# Altium footprint library 6-Connectors-2.PcbLib: 57 footprints (part 3 of 7) (continued)
## HARTING_02 02 160 2201 [mm] "Backplane Connector; Har-bus 64, Thru-Hole; Rows z+a+b+c+d, Press-in 160 Female Contacts" (continued)
  text "d" at 6.475,-0.45 h1.2
  text "c" at 2.275,1.425 h1.2
  text "z" at -5.725,1.375 h1.2
  text "a" at -3.14,1.39 h1.2
  text "b" at -0.425,1.4 h1.2
  text "30" at -10.675,-74.3 h1.2
  text "25" at -10.725,-61.6 h1.2
  text "20" at -10.675,-48.875 h1.2
  text "15" at -10.495,-36.185 h1.2
  text "10" at -10.495,-23.485 h1.2
  text "5" at -9.625,-10.795 h1.2
  text "32" at -10.7,-79.375 h1.2
  text "1" at -9.17,-0.675 h1.2
Drill Drawing:
  lines w0.1: -7.62,-58.42 -7.62,-81.28 7.62,-81.28 7.62,2.54 -7.62,2.54 -7.62,-20.32
  text "PRESS-FIT TECHNOLOGY diam. 1mm +0.1 -0" at -6.985,-56.515 h1
3D body "HARTING_02 02 160 2201.stp": height 11.6, standoff -4.95, extent -8,-86.82 8,8.08

## HARTING_02 02 160 2301 [mm] "Backplane Connector; Har-bus 64, 17mm Pres-in Terminations; Rows z+a+b+c+d, Press-in 160 Female Contacts"
height 11.6
pads (162):
  round 1.5 hole 1: a1(-2.54,0) a2(-2.54,-2.54) a3(-2.54,-5.08) a4(-2.54,-7.62) a5(-2.54,-10.16) a6(-2.54,-12.7) a7(-2.54,-15.24) a8(-2.54,-17.78) a9(-2.54,-20.32) a10(-2.54,-22.86) a11(-2.54,-25.4) a12(-2.54,-27.94) a13(-2.54,-30.48) a14(-2.54,-33.02) a15(-2.54,-35.56) a16(-2.54,-38.1) a17(-2.54,-40.64) a18(-2.54,-43.18) a19(-2.54,-45.72) a20(-2.54,-48.26) a21(-2.54,-50.8) a22(-2.54,-53.34) a23(-2.54,-55.88) a24(-2.54,-58.42) a25(-2.54,-60.96) a26(-2.54,-63.5) a27(-2.54,-66.04) a28(-2.54,-68.58) a29(-2.54,-71.12) a30(-2.54,-73.66) a31(-2.54,-76.2) a32(-2.54,-78.74) b1(0,0) b2(0,-2.54) b3(0,-5.08) b4(0,-7.62) b5(0,-10.16) b6(0,-12.7) b7(0,-15.24) b8(0,-17.78) b9(0,-20.32) b10(0,-22.86) b11(0,-25.4) b12(0,-27.94) b13(0,-30.48) b14(0,-33.02) b15(0,-35.56) b16(0,-38.1) b17(0,-40.64) b18(0,-43.18) b19(0,-45.72) b20(0,-48.26) b21(0,-50.8) b22(0,-53.34) b23(0,-55.88) b24(0,-58.42) b25(0,-60.96) b26(0,-63.5) b27(0,-66.04) b28(0,-68.58) b29(0,-71.12) b30(0,-73.66) b31(0,-76.2) b32(0,-78.74) c1(2.54,0) c2(2.54,-2.54) c3(2.54,-5.08) c4(2.54,-7.62) c5(2.54,-10.16) c6(2.54,-12.7) c7(2.54,-15.24) c8(2.54,-17.78) c9(2.54,-20.32) c10(2.54,-22.86) c11(2.54,-25.4) c12(2.54,-27.94) c13(2.54,-30.48) c14(2.54,-33.02) c15(2.54,-35.56) c16(2.54,-38.1) c17(2.54,-40.64) c18(2.54,-43.18) c19(2.54,-45.72) c20(2.54,-48.26) c21(2.54,-50.8) c22(2.54,-53.34) c23(2.54,-55.88) c24(2.54,-58.42) c25(2.54,-60.96) c26(2.54,-63.5) c27(2.54,-66.04) c28(2.54,-68.58) c29(2.54,-71.12) c30(2.54,-73.66) c31(2.54,-76.2) c32(2.54,-78.74) d1(5.08,0) d2(5.08,-2.54) d3(5.08,-5.08) d4(5.08,-7.62) d5(5.08,-10.16) d6(5.08,-12.7) d7(5.08,-15.24) d8(5.08,-17.78) d9(5.08,-20.32) d10(5.08,-22.86) d11(5.08,-25.4) d12(5.08,-27.94) d13(5.08,-30.48) d14(5.08,-33.02) d15(5.08,-35.56) d16(5.08,-38.1) d17(5.08,-40.64) d18(5.08,-43.18) d19(5.08,-45.72) d20(5.08,-48.26) d21(5.08,-50.8) d22(5.08,-53.34) d23(5.08,-55.88) d24(5.08,-58.42) d25(5.08,-60.96) d26(5.08,-63.5) d27(5.08,-66.04) d28(5.08,-68.58) d29(5.08,-71.12) d30(5.08,-73.66) d31(5.08,-76.2) d32(5.08,-78.74) z1(-5.08,0) z2(-5.08,-2.54) z3(-5.08,-5.08) z4(-5.08,-7.62) z5(-5.08,-10.16) z6(-5.08,-12.7) z7(-5.08,-15.24) z8(-5.08,-17.78) z9(-5.08,-20.32) z10(-5.08,-22.86) z11(-5.08,-25.4) z12(-5.08,-27.94) z13(-5.08,-30.48) z14(-5.08,-33.02) z15(-5.08,-35.56) z16(-5.08,-38.1) z17(-5.08,-40.64) z18(-5.08,-43.18) z19(-5.08,-45.72) z20(-5.08,-48.26) z21(-5.08,-50.8) z22(-5.08,-53.34) z23(-5.08,-55.88) z24(-5.08,-58.42) z25(-5.08,-60.96) z26(-5.08,-63.5) z27(-5.08,-66.04) z28(-5.08,-68.58) z29(-5.08,-71.12) z30(-5.08,-73.66) z31(-5.08,-76.2) z32(-5.08,-78.74)
  round 3.5 / inner round 3.5 / far side round 5.1 hole 2.8: MTG1(-0.3,5.63) MTG2(-0.3,-84.37)
Top Overlay:
  lines w0.2: -5.3,-84.395 -3.3,-84.395 -3.3,-86.82 ; -5.3,5.655 -3.3,5.655 -3.3,8.08 ; -4.25,-79.85 -4.25,-81.87 -1.9,-81.87 ; -4.25,1.11 -4.25,3.13 -1.9,3.13 ; -1.6,-86.82 -3.325,-86.82 -4.3,-86.82 cw(c-4.3,-85.82) -5.3,-85.82 -5.3,-84.37 -5.3,-81.725 -8,-81.725 -8,2.985 -5.3,2.985 -5.3,5.63 -5.3,7.08 cw(c-4.3,7.08) -4.3,8.08 -3.325,8.08 -1.6,8.08 ; 1,-86.82 2.725,-86.82 4.3,-86.82 ccw(c4.3,-85.82) 5.3,-85.82 5.3,-84.37 5.3,-81.725 8,-81.725 8,2.985 5.3,2.985 5.3,5.655 2.7,5.655 2.7,8.08 ; 1,8.08 2.725,8.08 4.3,8.08 cw(c4.3,7.08) 5.3,7.08 5.3,5.63 ; 1.25,-81.87 1.25,-80.87 4.25,-80.87 4.25,-80.01 ; 1.25,3.13 1.25,2.13 1.69,2.13 ; 2.7,-86.82 2.7,-84.395 5.3,-84.395 ; 3.81,2.13 4.25,2.13 4.25,1.27
  text "30" at -10.575,-74.3 h1.2
  text "25" at -10.625,-61.6 h1.2
  text "20" at -10.575,-48.875 h1.2
  text "15" at -10.395,-36.185 h1.2
  text "10" at -10.395,-23.485 h1.2
  text "5" at -9.525,-10.795 h1.2
  text "32" at -10.6,-79.375 h1.2
  text "1" at -9.07,-0.675 h1.2
  text "b" at -0.425,1.4 h1.2
  text "a" at -3.14,1.39 h1.2
  text "z" at -5.725,1.375 h1.2
  text "c" at 2.275,1.425 h1.2
  text "d" at 6.475,-0.45 h1.2
Mechanical 8:
  lines w0.1: -1.3,-84.37 -0.3,-84.37 ; -1.3,5.63 -0.3,5.63 ; -0.3,-85.37 -0.3,-84.37 ; -0.3,-83.37 -0.3,-84.37 ; -0.3,4.63 -0.3,5.63 ; -0.3,6.63 -0.3,5.63 ; 0.7,-84.37 -0.3,-84.37 ; 0.7,5.63 -0.3,5.63
Mechanical 14:
  circle w0.1: c-0.3,5.63 r1.425
  circle w0.1: c-0.3,-84.37 r1.425
  lines w0.1: -5.3,-84.395 -3.3,-84.395 ; -5.3,5.655 -3.3,5.655 ; -3.3,-86.82 -3.3,-84.395 ; -3.3,8.08 -3.3,5.655 ; -1.85,-81.87 -3.3,-84.395 ; -1.85,3.13 -3.3,5.655 ; -1.817,-81.87 1.217,-81.87 ; -1.817,3.13 1.217,3.13 ; 2.7,-86.82 2.7,-84.395 ; 2.7,8.08 2.7,5.655 ; 5.3,-84.395 2.7,-84.395 ; 5.3,5.63 5.3,7.08 ccw(c4.3,7.08) 4.3,8.08 2.725,8.08 -3.325,8.08 -4.3,8.08 ccw(c-4.3,7.08) -5.3,7.08 -5.3,5.63 -5.3,2.985 -8,2.985 -8,-81.725 -5.3,-81.725 -5.3,-84.37 -5.3,-85.82 ccw(c-4.3,-85.82) -4.3,-86.82 -3.325,-86.82 2.725,-86.82 4.3,-86.82 ccw(c4.3,-85.82) 5.3,-85.82 5.3,-84.37 5.3,-81.725 8,-81.725 8,2.985 5.3,2.985 5.3,5.655 2.7,5.655 ; 1.25,-81.87 1.25,-80.87 4.25,-80.87 4.25,2.13 1.25,2.13 1.25,3.13 ; 1.25,-81.87 -4.25,-81.87 -4.25,3.13 1.25,3.13 ; 1.25,-81.87 2.7,-84.395 ; 1.25,3.13 2.7,5.655
  text "1" at -9.07,-0.675 h1.2
  text "32" at -10.6,-79.375 h1.2
  text "5" at -9.525,-10.795 h1.2
  text "10" at -10.395,-23.485 h1.2
  text "15" at -10.395,-36.185 h1.2
  text "20" at -10.575,-48.875 h1.2
  text "25" at -10.625,-61.6 h1.2
  text "30" at -10.575,-74.3 h1.2
  text "b" at -0.425,1.4 h1.2
  text "a" at -3.14,1.39 h1.2
  text "z" at -5.725,1.375 h1.2
  text "c" at 2.275,1.425 h1.2
  text "d" at 6.475,-0.45 h1.2
Drill Drawing:
  lines w0.1: -7.62,-58.42 -7.62,-81.28 7.62,-81.28 7.62,2.54 -7.62,2.54 -7.62,-20.32
  text "PRESS-FIT TECHNOLOGY diam. 1mm +0.1 -0" at -6.985,-56.515 h1
3D body "HARTING_02 02 160 2301.stp": height 11.6, standoff -17, extent -8,-86.82 8,8.08

## HARTING_02 44 000 0001 [mm] "Backplane Connector; Har-bus 64, Thru-Hole; Rows z+a+b+c+d, Press-in 160 Female Contacts"
height 15.5
Top Overlay:
  lines w0.2: -7.7,-78.72 -6.9,-78.72 ; -7.7,-0.02 -6.9,-0.02 ; -4.55,3.23 -4.55,8.13 ; -3,-86.87 -3,-79.27 2.4,-79.27 2.4,-86.87 ; -3,-86.289 -3.712,-86.289 -3.712,-83.451 -3,-83.451 ; -3,-81.97 -6.9,-81.97 -6.9,3.23 -3,3.23 ; -3,2.54 -3,8.13 ; -3,4.711 -3.712,4.711 -3.712,7.549 -3,7.549 ; -1.905,-86.87 -7.7,-86.87 -7.7,8.13 -1.905,8.13 ; 1.905,-86.87 7.7,-86.87 7.7,8.13 1.905,8.13 ; 2.4,-86.289 3.112,-86.289 3.109,-83.453 2.4,-83.451 ; 2.4,-81.97 4.4,-81.97 4.4,-80.97 6.9,-80.97 6.9,2.23 6.5,2.23 ; 2.4,2.54 2.4,8.13 ; 2.4,3.23 4.4,3.23 4.4,2.23 ; 2.4,4.711 3.112,4.711 3.103,7.541 2.4,7.541 ; 3.95,3.23 3.95,8.13 ; 6.9,-78.72 7.7,-78.72 ; 6.9,-0.02 7.7,-0.02
  text "30" at -10.575,-74.3 h1.2
  text "25" at -10.625,-61.6 h1.2
  text "20" at -10.575,-48.875 h1.2
  text "15" at -10.395,-36.185 h1.2
  text "10" at -10.395,-23.485 h1.2
  text "5" at -9.525,-10.795 h1.2
  text "32" at -10.6,-79.375 h1.2
  text "1" at -9.07,-0.675 h1.2
  text "z" at 5.15,1.175 h1.2
  text "a" at 2.275,1.2 h1.2
  text "d" at -5.725,1.15 h1.2
  text "c" at -3.14,1.165 h1.2
  text "b" at -0.425,1.175 h1.2
Mechanical 8:
  lines w0.1: -1.3,-84.37 -0.3,-84.37 ; -1.3,5.63 -0.3,5.63 ; -0.5,0 0,0 ; -0.3,-85.37 -0.3,-84.37 ; -0.3,-83.37 -0.3,-84.37 ; -0.3,4.63 -0.3,5.63 ; -0.3,6.63 -0.3,5.63 ; 0,-0.5 0,0 ; 0,0.5 0,0 ; 0.5,0 0,0 ; 0.7,-84.37 -0.3,-84.37 ; 0.7,5.63 -0.3,5.63
Mechanical 14:
  lines w0.1: -7.7,-78.72 -6.9,-78.72 ; -7.7,-0.02 -6.9,-0.02 ; -4.55,3.23 -4.55,8.13 ; -3,-86.87 -3,-79.27 2.4,-79.27 2.4,-86.87 ; -3,-86.289 -3.712,-86.289 -3.712,-83.451 -3,-83.451 ; -3,-81.97 -6.9,-81.97 -6.9,3.23 -3,3.23 ; -3,4.711 -3.712,4.711 -3.712,7.549 -3,7.549 ; -3,7.13 2.4,7.13 ; -3,8.13 -3,0.53 2.4,0.53 2.4,8.13 ; 2.4,-86.289 3.112,-86.289 3.109,-83.453 2.4,-83.451 ; 2.4,-81.97 4.4,-81.97 4.4,-80.97 6.9,-80.97 6.9,2.23 4.4,2.23 4.4,3.23 2.4,3.23 ; 2.4,4.711 3.112,4.711 3.103,7.541 2.4,7.541 ; 3.95,3.23 3.95,8.13 ; 6.9,-78.72 7.7,-78.72 ; 6.9,-0.02 7.7,-0.02 ; -7.7,-86.87 -7.7,8.13 7.7,8.13 7.7,-86.87 -7.7,-86.87
  text "b" at -0.425,1.175 h1.2
  text "c" at -3.14,1.165 h1.2
  text "d" at -5.725,1.15 h1.2
  text "a" at 2.275,1.2 h1.2
  text "z" at 5.15,1.175 h1.2
  text "1" at -9.07,-0.675 h1.2
  text "32" at -10.6,-79.375 h1.2
  text "5" at -9.525,-10.795 h1.2
  text "10" at -10.395,-23.485 h1.2
  text "15" at -10.395,-36.185 h1.2
  text "20" at -10.575,-48.875 h1.2
  text "25" at -10.625,-61.6 h1.2
  text "30" at -10.575,-74.3 h1.2
3D body "HARTING_02 44 000 0001.stp": height 15.5, standoff 0, extent -7.7,-86.87 7.7,8.13

## HARTING_09 02 164 2921 [mm] "Connector; DIN 41612, Type B, Thru-Hole; Rows a+b, 64 Position; Right Angle"
height 8.5
pads (66):
  round 1.7 hole 1: a1(0,0) a2(0,-2.54) a3(0,-5.08) a4(0,-7.62) a5(0,-10.16) a6(0,-12.7) a7(0,-15.24) a8(0,-17.78) a9(0,-20.32) a10(0,-22.86) a11(0,-25.4) a12(0,-27.94) a13(0,-30.48) a14(0,-33.02) a15(0,-35.56) a16(0,-38.1) a17(0,-40.64) a18(0,-43.18) a19(0,-45.72) a20(0,-48.26) a21(0,-50.8) a22(0,-53.34) a23(0,-55.88) a24(0,-58.42) a25(0,-60.96) a26(0,-63.5) a27(0,-66.04) a28(0,-68.58) a29(0,-71.12) a30(0,-73.66) a31(0,-76.2) a32(0,-78.74) b1(-2.54,0) b2(-2.54,-2.54) b3(-2.54,-5.08) b4(-2.54,-7.62) b5(-2.54,-10.16) b6(-2.54,-12.7) b7(-2.54,-15.24) b8(-2.54,-17.78) b9(-2.54,-20.32) b10(-2.54,-22.86) b11(-2.54,-25.4) b12(-2.54,-27.94) b13(-2.54,-30.48) b14(-2.54,-33.02) b15(-2.54,-35.56) b16(-2.54,-38.1) b17(-2.54,-40.64) b18(-2.54,-43.18) b19(-2.54,-45.72) b20(-2.54,-48.26) b21(-2.54,-50.8) b22(-2.54,-53.34) b23(-2.54,-55.88) b24(-2.54,-58.42) b25(-2.54,-60.96) b26(-2.54,-63.5) b27(-2.54,-66.04) b28(-2.54,-68.58) b29(-2.54,-71.12) b30(-2.54,-73.66) b31(-2.54,-76.2) b32(-2.54,-78.74)
  round 3.5 / inner round 3.5 / far side round 5.1 hole 2.8: MTG1(2.54,5.08) MTG2(2.54,-83.82)
Top Overlay:
  drawing of 227 lines, arcs and shapes, not listed
  text "30" at -5.98,-74.285 h1.2
  text "25" at -6,-61.575 h1.2
  text "20" at -6.055,-48.81 h1.2
  text "15" at -5.83,-36.235 h1.2
  text "10" at -5.83,-23.535 h1.2
  text "5" at -4.855,-10.785 h1.2
  text "32" at -5.955,-79.365 h1.2
  text "a" at -0.95,1.99 h1.2
  text "b" at -2.65,2.025 h1.2
  text "1" at -4.505,-0.725 h1.2
Mechanical 8:
  lines w0.1: -5.08,-39.37 12.64,-39.37 ; 5.3,-86.3 5.3,7.5
  text "PCB" at 5.08,-41.275 h1.2
Mechanical 14:
  drawing of 161 lines, arcs and shapes, not listed
  text "5" at -4.855,-10.785 h1.2
  text "1" at -4.505,-0.725 h1.2
  text "30" at -5.98,-74.285 h1.2
  text "20" at -6.055,-48.81 h1.2
  text "10" at -5.83,-23.535 h1.2
  text "32" at -5.955,-79.365 h1.2
  text "b" at -2.65,2.025 h1.2
  text "a" at -0.95,1.99 h1.2
3D body "v160-080.stp": height 0.02, standoff -1.65, extent -3.34,-79.54 -1.74,-77.94
3D body "v160-080.stp": height 0.02, standoff -1.65, extent -0.8,-79.54 0.8,-77.94
3D body "v160-080.stp": height 0.02, standoff -1.65, extent -3.34,-77 -1.74,-75.4
3D body "v160-080.stp": height 0.02, standoff -1.65, extent -0.8,-77 0.8,-75.4
3D body "v160-080.stp": height 0.02, standoff -1.65, extent -3.34,-74.46 -1.74,-72.86
3D body "v160-080.stp": height 0.02, standoff -1.65, extent -0.8,-74.46 0.8,-72.86
3D body "v160-080.stp": height 0.02, standoff -1.65, extent -3.34,-71.92 -1.74,-70.32
3D body "v160-080.stp": height 0.02, standoff -1.65, extent -0.8,-71.92 0.8,-70.32
3D body "v160-080.stp": height 0.02, standoff -1.65, extent -3.34,-69.38 -1.74,-67.78
3D body "v160-080.stp": height 0.02, standoff -1.65, extent -0.8,-69.38 0.8,-67.78
3D body "v160-080.stp": height 0.02, standoff -1.65, extent -3.34,-66.84 -1.74,-65.24
3D body "v160-080.stp": height 0.02, standoff -1.65, extent -0.8,-66.84 0.8,-65.24
3D body "v160-080.stp": height 0.02, standoff -1.65, extent -3.34,-64.3 -1.74,-62.7
3D body "v160-080.stp": height 0.02, standoff -1.65, extent -0.8,-64.3 0.8,-62.7
3D body "v160-080.stp": height 0.02, standoff -1.65, extent -3.34,-61.76 -1.74,-60.16
3D body "v160-080.stp": height 0.02, standoff -1.65, extent -0.8,-61.76 0.8,-60.16
3D body "v160-080.stp": height 0.02, standoff -1.65, extent -3.34,-59.22 -1.74,-57.62
3D body "v160-080.stp": height 0.02, standoff -1.65, extent -0.8,-59.22 0.8,-57.62
3D body "v160-080.stp": height 0.02, standoff -1.65, extent -3.34,-56.68 -1.74,-55.08
3D body "v160-080.stp": height 0.02, standoff -1.65, extent -0.8,-56.68 0.8,-55.08
3D body "v160-080.stp": height 0.02, standoff -1.65, extent -3.34,-54.14 -1.74,-52.54
3D body "v160-080.stp": height 0.02, standoff -1.65, extent -0.8,-54.14 0.8,-52.54
3D body "v160-080.stp": height 0.02, standoff -1.65, extent -3.34,-51.6 -1.74,-50
3D body "v160-080.stp": height 0.02, standoff -1.65, extent -0.8,-51.6 0.8,-50
3D body "v160-080.stp": height 0.02, standoff -1.65, extent -3.34,-49.06 -1.74,-47.46
3D body "v160-080.stp": height 0.02, standoff -1.65, extent -0.8,-49.06 0.8,-47.46
3D body "v160-080.stp": height 0.02, standoff -1.65, extent -3.34,-46.52 -1.74,-44.92
3D body "v160-080.stp": height 0.02, standoff -1.65, extent -0.8,-46.52 0.8,-44.92
3D body "v160-080.stp": height 0.02, standoff -1.65, extent -3.34,-43.98 -1.74,-42.38
3D body "v160-080.stp": height 0.02, standoff -1.65, extent -0.8,-43.98 0.8,-42.38
3D body "v160-080.stp": height 0.02, standoff -1.65, extent -3.34,-41.44 -1.74,-39.84
3D body "v160-080.stp": height 0.02, standoff -1.65, extent -0.8,-41.44 0.8,-39.84
3D body "v160-080.stp": height 0.02, standoff -1.65, extent -3.34,-38.9 -1.74,-37.3
3D body "v160-080.stp": height 0.02, standoff -1.65, extent -0.8,-38.9 0.8,-37.3
3D body "v160-080.stp": height 0.02, standoff -1.65, extent -3.34,-36.36 -1.74,-34.76
3D body "v160-080.stp": height 0.02, standoff -1.65, extent -0.8,-36.36 0.8,-34.76
3D body "v160-080.stp": height 0.02, standoff -1.65, extent -3.34,-33.82 -1.74,-32.22
3D body "v160-080.stp": height 0.02, standoff -1.65, extent -0.8,-33.82 0.8,-32.22
3D body "v160-080.stp": height 0.02, standoff -1.65, extent -3.34,-31.28 -1.74,-29.68
3D body "v160-080.stp": height 0.02, standoff -1.65, extent -0.8,-31.28 0.8,-29.68
3D body "v160-080.stp": height 0.02, standoff -1.65, extent -3.34,-28.74 -1.74,-27.14
3D body "v160-080.stp": height 0.02, standoff -1.65, extent -0.8,-28.74 0.8,-27.14
3D body "v160-080.stp": height 0.02, standoff -1.65, extent -3.34,-23.66 -1.74,-22.06
3D body "v160-080.stp": height 0.02, standoff -1.65, extent -0.8,-23.66 0.8,-22.06
3D body "v160-080.stp": height 0.02, standoff -1.65, extent -3.34,-21.12 -1.74,-19.52
3D body "v160-080.stp": height 0.02, standoff -1.65, extent -0.8,-21.12 0.8,-19.52
3D body "v160-080.stp": height 0.02, standoff -1.65, extent -3.34,-18.58 -1.74,-16.98
3D body "v160-080.stp": height 0.02, standoff -1.65, extent -0.8,-18.58 0.8,-16.98
3D body "v160-080.stp": height 0.02, standoff -1.65, extent -3.34,-16.04 -1.74,-14.44
3D body "v160-080.stp": height 0.02, standoff -1.65, extent -0.8,-16.04 0.8,-14.44
3D body "v160-080.stp": height 0.02, standoff -1.65, extent -3.34,-13.5 -1.74,-11.9
3D body "v160-080.stp": height 0.02, standoff -1.65, extent -0.8,-13.5 0.8,-11.9
3D body "v160-080.stp": height 0.02, standoff -1.65, extent -3.34,-10.96 -1.74,-9.36
3D body "v160-080.stp": height 0.02, standoff -1.65, extent -0.8,-10.96 0.8,-9.36
3D body "v160-080.stp": height 0.02, standoff -1.65, extent -3.34,-8.42 -1.74,-6.82
3D body "v160-080.stp": height 0.02, standoff -1.65, extent -0.8,-8.42 0.8,-6.82
3D body "v160-080.stp": height 0.02, standoff -1.65, extent -3.34,-5.88 -1.74,-4.28
3D body "v160-080.stp": height 0.02, standoff -1.65, extent -0.8,-5.88 0.8,-4.28
3D body "v160-080.stp": height 0.02, standoff -1.65, extent -3.34,-3.34 -1.74,-1.74
3D body "v160-080.stp": height 0.02, standoff -1.65, extent -0.8,-3.34 0.8,-1.74
3D body "v160-080.stp": height 0.02, standoff -1.65, extent -3.34,-0.8 -1.74,0.8
3D body "v160-080.stp": height 0.02, standoff -1.65, extent -0.8,-0.8 0.8,0.8
3D body "HARTING_09 02 164 2921.stp": height 6.83, standoff -3, extent -2.838,-86.37 12.642,7.63

## HARTING_09 02 264 6825 [mm] "DIN 41612, Type B, Thru-Hole; Rows a+b, 64 Position, Straight Female Connector"
height 11.6
pads (66):
  round 1.7 hole 1: a1(0,0) a2(0,-2.54) a3(0,-5.08) a4(0,-7.62) a5(0,-10.16) a6(0,-12.7) a7(0,-15.24) a8(0,-17.78) a9(0,-20.32) a10(0,-22.86) a11(0,-25.4) a12(0,-27.94) a13(0,-30.48) a14(0,-33.02) a15(0,-35.56) a16(0,-38.1) a17(0,-40.64) a18(0,-43.18) a19(0,-45.72) a20(0,-48.26) a21(0,-50.8) a22(0,-53.34) a23(0,-55.88) a24(0,-58.42) a25(0,-60.96) a26(0,-63.5) a27(0,-66.04) a28(0,-68.58) a29(0,-71.12) a30(0,-73.66) a31(0,-76.2) a32(0,-78.74) b1(2.54,0) b2(2.54,-2.54) b3(2.54,-5.08) b4(2.54,-7.62) b5(2.54,-10.16) b6(2.54,-12.7) b7(2.54,-15.24) b8(2.54,-17.78) b9(2.54,-20.32) b10(2.54,-22.86) b11(2.54,-25.4) b12(2.54,-27.94) b13(2.54,-30.48) b14(2.54,-33.02) b15(2.54,-35.56) b16(2.54,-38.1) b17(2.54,-40.64) b18(2.54,-43.18) b19(2.54,-45.72) b20(2.54,-48.26) b21(2.54,-50.8) b22(2.54,-53.34) b23(2.54,-55.88) b24(2.54,-58.42) b25(2.54,-60.96) b26(2.54,-63.5) b27(2.54,-66.04) b28(2.54,-68.58) b29(2.54,-71.12) b30(2.54,-73.66) b31(2.54,-76.2) b32(2.54,-78.74)
  round 3.5 / inner round 3.5 / far side round 5.1 hole 2.8: MTG1(2.24,5.63) MTG2(2.24,-84.37)
Top Overlay:
  lines w0.2: -2.73,-84.37 -0.71,-84.37 ; -2.73,5.63 -0.71,5.63 ; -1.08,-79.8 -1.08,-81.22 ; -1.08,1.06 -1.08,2.48 ; -0.71,-86.82 -0.71,-83.82 0.416,-81.87 ; -0.71,8.08 -0.71,5.08 0.416,3.13 ; 1.275,-86.82 -2.73,-86.82 -2.73,8.08 1.275,8.08 ; 3.2,-86.82 5.27,-86.82 5.27,8.08 3.2,8.08 ; 3.62,-79.375 3.62,-80.17 ; 3.62,0.635 3.62,1.43 ; 4.693,-82.82 5.27,-82.82 ; 4.693,4.075 5.27,4.075 ; -1.73,-81.87 -1.08,-81.22 ; -1.73,-81.87 -1.73,3.13 ; -1.73,-81.87 1.17,-81.87 ; -1.73,3.13 -1.08,2.48 ; -1.73,3.13 1.17,3.13 ; -1.08,-81.22 0.52,-81.22 ; -1.08,2.48 0.52,2.48 ; 0.52,-81.22 1.17,-81.87 ; 0.52,-81.22 0.52,-80.17 ; 0.52,-80.17 1.17,-80.82 ; 0.52,-80.17 3.62,-80.17 ; 0.52,1.43 1.17,2.08 ; 0.52,1.43 0.52,2.48 ; 0.52,1.43 3.62,1.43 ; 0.52,2.48 1.17,3.13 ; 1.17,-81.87 1.17,-80.82 ; 1.17,-80.82 4.27,-80.82 ; 1.17,2.08 4.27,2.08 ; 1.17,2.08 1.17,3.13 ; 3.62,-80.17 4.27,-80.82 ; 3.62,1.43 4.27,2.08 ; 4.27,-80.82 4.27,2.08
  text "b" at 5.945,-0.574 h1.2
  text "a" at -2.001,3.81 h1.2
  text "32" at -5.575,-79.44 h1.2
  text "5" at -4.35,-10.91 h1.2
  text "10" at -5.275,-23.56 h1.2
  text "30" at -5.575,-74.36 h1.2
  text "25" at -5.575,-61.66 h1.2
  text "20" at -5.575,-48.96 h1.2
  text "15" at -5.275,-36.26 h1.2
  text "1" at -4.15,-0.75 h1.2
Mechanical 8:
  drawing of 262 lines, arcs and shapes, not listed
Mechanical 14:
  lines w0.1: -2.73,-84.37 -0.71,-84.37 ; -2.73,5.63 -0.71,5.63 ; -0.71,-86.82 -0.71,-83.82 0.416,-81.87 ; -0.71,8.08 -0.71,5.08 0.416,3.13 ; 5.27,-82.82 4.693,-82.82 4.144,-81.87 -1.73,-81.87 ; 5.27,4.08 4.693,4.08 4.144,3.13 -1.73,3.13 ; -1.73,-81.87 -1.08,-81.22 ; -1.73,-81.87 -1.73,3.13 ; -1.73,3.13 -1.08,2.48 ; -1.08,-81.22 -1.08,2.48 ; -1.08,-81.22 0.52,-81.22 ; -1.08,2.48 0.52,2.48 ; 0.52,-81.22 1.17,-81.87 1.17,-80.82 ; 0.52,-81.22 0.52,-80.17 ; 0.52,-80.17 1.17,-80.82 ; 0.52,-80.17 3.62,-80.17 ; 0.52,1.43 1.17,2.08 ; 0.52,1.43 0.52,2.48 ; 0.52,1.43 3.62,1.43 ; 0.52,2.48 1.17,3.13 1.17,2.08 ; 1.17,-80.82 4.27,-80.82 ; 1.17,2.08 4.27,2.08 ; 3.62,-80.17 4.27,-80.82 ; 3.62,-80.17 3.62,1.43 ; 3.62,1.43 4.27,2.08 ; 4.27,-80.82 4.27,2.08 ; -2.73,-86.82 -2.73,8.08 5.27,8.08 5.27,-86.82 -2.73,-86.82
  text "1" at -4.15,-0.75 h1.2
  text "b" at 5.945,-0.574 h1.2
  text "a" at -2.001,3.81 h1.2
  text "32" at -5.575,-79.44 h1.2
  text "5" at -4.35,-10.91 h1.2
  text "10" at -5.275,-23.56 h1.2
  text "15" at -5.275,-36.26 h1.2
  text "20" at -5.575,-48.96 h1.2
  text "25" at -5.575,-61.66 h1.2
  text "30" at -5.575,-74.36 h1.2
3D body "HARTING_09 02 264 6825.stp": height 11.6, standoff -4.5, extent -2.73,-86.82 5.27,8.08

## HARTING_09 02 264 6850 [mm] "DIN 41612, Type B, Thru-Hole Press-in; Rows a+b, 64 Position, Straight Female Connector"
height 11.6
pads (66):
  round 1.7 hole 1: a1(0,0) a2(0,-2.54) a3(0,-5.08) a4(0,-7.62) a5(0,-10.16) a6(0,-12.7) a7(0,-15.24) a8(0,-17.78) a9(0,-20.32) a10(0,-22.86) a11(0,-25.4) a12(0,-27.94) a13(0,-30.48) a14(0,-33.02) a15(0,-35.56) a16(0,-38.1) a17(0,-40.64) a18(0,-43.18) a19(0,-45.72) a20(0,-48.26) a21(0,-50.8) a22(0,-53.34) a23(0,-55.88) a24(0,-58.42) a25(0,-60.96) a26(0,-63.5) a27(0,-66.04) a28(0,-68.58) a29(0,-71.12) a30(0,-73.66) a31(0,-76.2) a32(0,-78.74) b1(2.54,0) b2(2.54,-2.54) b3(2.54,-5.08) b4(2.54,-7.62) b5(2.54,-10.16) b6(2.54,-12.7) b7(2.54,-15.24) b8(2.54,-17.78) b9(2.54,-20.32) b10(2.54,-22.86) b11(2.54,-25.4) b12(2.54,-27.94) b13(2.54,-30.48) b14(2.54,-33.02) b15(2.54,-35.56) b16(2.54,-38.1) b17(2.54,-40.64) b18(2.54,-43.18) b19(2.54,-45.72) b20(2.54,-48.26) b21(2.54,-50.8) b22(2.54,-53.34) b23(2.54,-55.88) b24(2.54,-58.42) b25(2.54,-60.96) b26(2.54,-63.5) b27(2.54,-66.04) b28(2.54,-68.58) b29(2.54,-71.12) b30(2.54,-73.66) b31(2.54,-76.2) b32(2.54,-78.74)
  round 3.5 / inner round 3.5 / far side round 5.1 hole 2.8: MTG1(2.24,5.63) MTG2(2.24,-84.37)
Top Overlay:
  lines w0.2: -2.73,-84.37 -0.71,-84.37 ; -2.73,5.63 -0.71,5.63 ; -1.08,-79.8 -1.08,-81.22 ; -1.08,1.06 -1.08,2.48 ; -0.71,-86.82 -0.71,-83.82 0.416,-81.87 ; -0.71,8.08 -0.71,5.08 0.416,3.13 ; 1.275,-86.82 -2.73,-86.82 -2.73,8.08 1.275,8.08 ; 3.2,-86.82 5.27,-86.82 5.27,8.08 3.2,8.08 ; 3.62,-79.375 3.62,-80.17 ; 3.62,0.635 3.62,1.43 ; 4.693,-82.82 5.27,-82.82 ; 4.693,4.075 5.27,4.075 ; -1.73,-81.87 -1.08,-81.22 ; -1.73,-81.87 -1.73,3.13 ; -1.73,-81.87 1.17,-81.87 ; -1.73,3.13 -1.08,2.48 ; -1.73,3.13 1.17,3.13 ; -1.08,-81.22 0.52,-81.22 ; -1.08,2.48 0.52,2.48 ; 0.52,-81.22 1.17,-81.87 ; 0.52,-81.22 0.52,-80.17 ; 0.52,-80.17 1.17,-80.82 ; 0.52,-80.17 3.62,-80.17 ; 0.52,1.43 1.17,2.08 ; 0.52,1.43 0.52,2.48 ; 0.52,1.43 3.62,1.43 ; 0.52,2.48 1.17,3.13 ; 1.17,-81.87 1.17,-80.82 ; 1.17,-80.82 4.27,-80.82 ; 1.17,2.08 4.27,2.08 ; 1.17,2.08 1.17,3.13 ; 3.62,-80.17 4.27,-80.82 ; 3.62,1.43 4.27,2.08 ; 4.27,-80.82 4.27,2.08
  text "32" at -5.6,-79.44 h1.2
  text "5" at -4.375,-10.91 h1.2
  text "10" at -5.3,-23.56 h1.2
  text "30" at -5.6,-74.36 h1.2
  text "25" at -5.6,-61.66 h1.2
  text "20" at -5.6,-48.96 h1.2
  text "15" at -5.3,-36.26 h1.2
  text "1" at -4.175,-0.75 h1.2
  text "a" at -2.051,3.86 h1.2
Mechanical 8:
  drawing of 262 lines, arcs and shapes, not listed
Mechanical 14:
  lines w0.1: -2.73,-84.37 -0.71,-84.37 ; -2.73,5.63 -0.71,5.63 ; -0.71,-86.82 -0.71,-83.82 0.416,-81.87 ; -0.71,8.08 -0.71,5.08 0.416,3.13 ; 5.27,-82.82 4.693,-82.82 4.144,-81.87 -1.73,-81.87 ; 5.27,4.08 4.693,4.08 4.144,3.13 -1.73,3.13 ; -1.73,-81.87 -1.08,-81.22 ; -1.73,-81.87 -1.73,3.13 ; -1.73,3.13 -1.08,2.48 ; -1.08,-81.22 -1.08,2.48 ; -1.08,-81.22 0.52,-81.22 ; -1.08,2.48 0.52,2.48 ; 0.52,-81.22 1.17,-81.87 1.17,-80.82 ; 0.52,-81.22 0.52,-80.17 ; 0.52,-80.17 1.17,-80.82 ; 0.52,-80.17 3.62,-80.17 ; 0.52,1.43 1.17,2.08 ; 0.52,1.43 0.52,2.48 ; 0.52,1.43 3.62,1.43 ; 0.52,2.48 1.17,3.13 1.17,2.08 ; 1.17,-80.82 4.27,-80.82 ; 1.17,2.08 4.27,2.08 ; 3.62,-80.17 4.27,-80.82 ; 3.62,-80.17 3.62,1.43 ; 3.62,1.43 4.27,2.08 ; 4.27,-80.82 4.27,2.08 ; -2.73,-86.82 -2.73,8.08 5.27,8.08 5.27,-86.82 -2.73,-86.82
  text "1" at -4.175,-0.75 h1.2
  text "32" at -5.6,-79.44 h1.2
  text "5" at -4.375,-10.91 h1.2
  text "10" at -5.3,-23.56 h1.2
  text "15" at -5.3,-36.26 h1.2
  text "20" at -5.6,-48.96 h1.2
  text "25" at -5.6,-61.66 h1.2
  text "30" at -5.6,-74.36 h1.2
  text "a" at -2.051,3.86 h1.2
Drill Drawing:
  lines w0.1: -1.83,-59.13 -1.83,-80.17 4.25,-80.17 4.25,1.43 -1.73,1.43 -1.73,-21.03
  text "PRESS-FIT TECHNOLOGY diam. 1mm +0.1 -0" at -1.315,-57.225 h1
3D body "HARTING_09 02 264 6850.stp": height 11.6, standoff -4.5, extent -2.73,-86.82 5.27,8.08